# Altium footprint library ICs And Semiconductors THD.PcbLib: 350 footprints (part 6 of 22)
Each footprint in its own frame and in the unit in brackets; x right, y up, seen from the top. Pads: shape width x height; smd on the part's side, far side on the other; paste and mask are expansions set on the pad; w line width, h text height; cw(c..) or ccw(c..) is an arc to the next point about the centre after c.
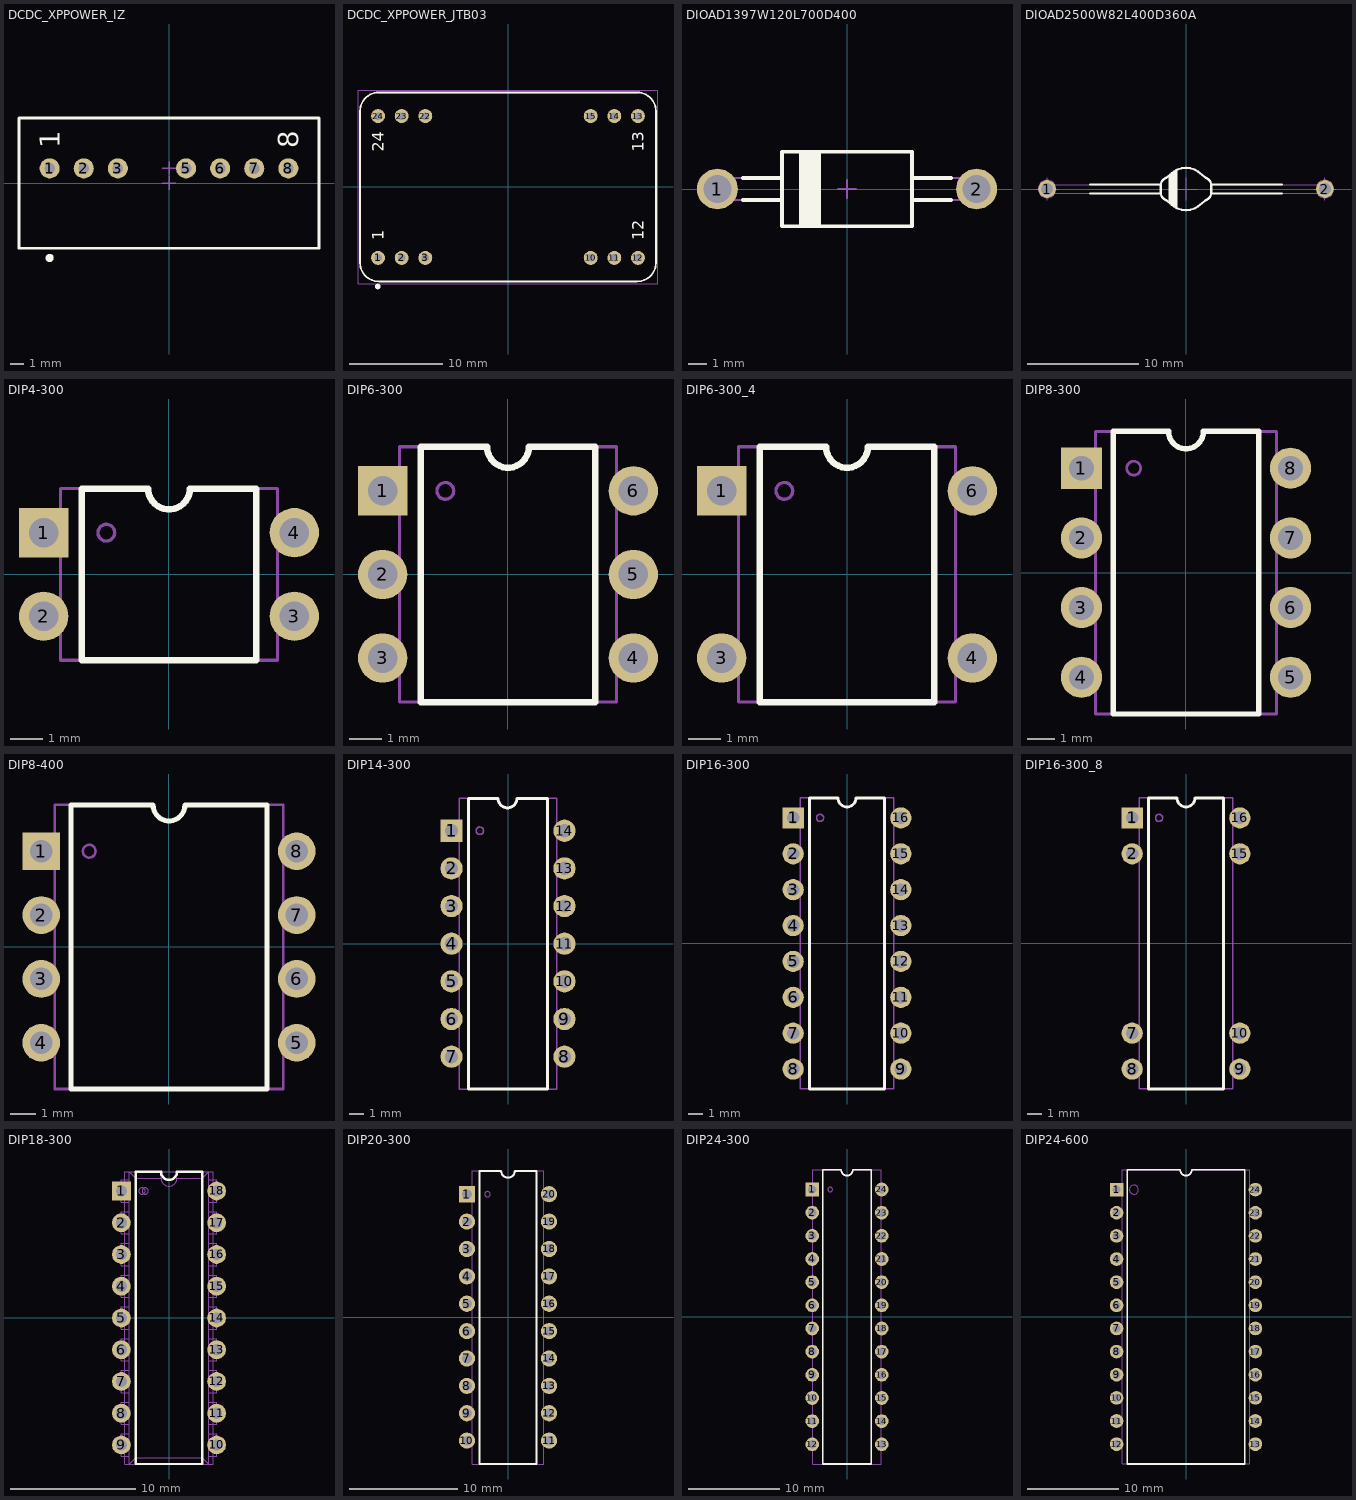
[diagram p5: the footprints below, top view; thin cyan lines are the x and y axes]

## DCDC_XPPOWER_IZ [mm] "SIP-8 Package DC-DC Converter,Body 21.85x11.1mm, IZ Serie"
height 11.6
pads (7):
  round 1.5 hole 0.8: 1(-8.89,1.1) 2(-6.35,1.1) 3(-3.81,1.1) 5(1.27,1.1) 6(3.81,1.1) 7(6.35,1.1) 8(8.89,1.1)
Top Overlay:
  circle w0.3: c-8.89,-5.567 r0.15
  lines w0.2: -11.175,-4.85 -11.175,4.85 11.175,4.85 11.175,-4.85 -11.175,-4.85
  text "8" at 9.64,2.6 h1.5
  text "1" at -8.14,2.6 h1.5
Notvisible:
  lines w0.1: -9.39,1.1 -8.89,1.1 ; -8.89,0.6 -8.89,1.1 ; -8.89,1.6 -8.89,1.1 ; -8.39,1.1 -8.89,1.1 ; -6.85,1.1 -6.35,1.1 ; -6.35,0.6 -6.35,1.1 ; -6.35,1.6 -6.35,1.1 ; -5.85,1.1 -6.35,1.1 ; -4.31,1.1 -3.81,1.1 ; -3.81,0.6 -3.81,1.1 ; -3.81,1.6 -3.81,1.1 ; -3.31,1.1 -3.81,1.1 ; -0.5,0 0,0 ; -0.5,1.1 0,1.1 ; 0,-0.5 0,0 ; 0,0.5 0,0 ; 0,0.6 0,1.1 ; 0,1.6 0,1.1 ; 0.5,0 0,0 ; 0.5,1.1 0,1.1 ; 0.77,1.1 1.27,1.1 ; 1.27,0.6 1.27,1.1 ; 1.27,1.6 1.27,1.1 ; 1.77,1.1 1.27,1.1 ; 3.31,1.1 3.81,1.1 ; 3.81,0.6 3.81,1.1 ; 3.81,1.6 3.81,1.1 ; 4.31,1.1 3.81,1.1 ; 5.85,1.1 6.35,1.1 ; 6.35,0.6 6.35,1.1 ; 6.35,1.6 6.35,1.1 ; 6.85,1.1 6.35,1.1 ; 8.39,1.1 8.89,1.1 ; 8.89,0.6 8.89,1.1 ; 8.89,1.6 8.89,1.1 ; 9.39,1.1 8.89,1.1
  text "2" at -5.6,2.6 h1.5
  text "3" at -3.06,2.6 h1.5
  text "5" at 2.02,2.6 h1.5
  text "6" at 4.56,2.6 h1.5
  text "7" at 7.1,2.6 h1.5
Mechanical 14:
  lines w0.1: -11.175,-4.85 11.175,-4.85 11.175,4.85 -11.175,4.85 -11.175,-4.85
  text "8" at 9.64,2.6 h1.5
  text "1" at -8.14,2.6 h1.5
3D body "DCDC_XPPOWER_IZ.stp": height 11.6, standoff -3.05, extent -11.175,-4.85 11.175,4.85

## DCDC_XPPOWER_JTB03 [mm] "JTB03 Series , Body 31.8x20.3mm, Pitch 2.54mm"
height 10.2
pads (12):
  round 1.5 hole 0.8: 1(-13.97,-7.62) 2(-11.43,-7.62) 3(-8.89,-7.62) 10(8.89,-7.62) 11(11.43,-7.62) 12(13.97,-7.62) 13(13.97,7.62) 14(11.43,7.62) 15(8.89,7.62) 22(-8.89,7.62) 23(-11.43,7.62) 24(-13.97,7.62)
Top Overlay:
  circle w0.3: c-14,-10.7 r0.15
  lines w0.2: -15.9,-8.15 ccw(c-13.9,-8.15) -13.9,-10.15 13.9,-10.15 ccw(c13.9,-8.15) 15.9,-8.15 15.9,8.15 ccw(c13.9,8.15) 13.9,10.15 -13.9,10.15 ccw(c-13.9,8.15) -15.9,8.15 -15.9,-8.15
  text "12" at 14.605,-5.715 h1.27
  text "24" at -13.335,3.81 h1.27
  text "13" at 14.605,3.81 h1.27
  text "1" at -13.335,-5.715 h1.27
Mechanical 14:
  lines w0.1: -15.9,-8.15 ccw(c-13.9,-8.15) -13.9,-10.15 ; -15.9,-8.15 ccw(c-13.9,-8.15) -13.9,-10.15 ; -15.9,-8.15 ccw(c-13.9,-8.15) -13.9,-10.15 ; -15.9,-8.15 -15.9,8.15 ; -15.9,-8.15 -15.9,8.15 ; -15.9,-8.15 -15.9,8.15 ; -15.9,8.15 cw(c-13.9,8.15) -13.9,10.15 ; -15.9,8.15 cw(c-13.9,8.15) -13.9,10.15 ; -15.9,8.15 cw(c-13.9,8.15) -13.9,10.15 ; -13.9,-10.15 13.9,-10.15 ; -13.9,-10.15 13.9,-10.15 ; -13.9,-10.15 13.9,-10.15 ; -13.9,10.15 13.9,10.15 ; -13.9,10.15 13.9,10.15 ; -13.9,10.15 13.9,10.15 ; 13.9,-10.15 ccw(c13.9,-8.15) 15.9,-8.15 ; 13.9,-10.15 ccw(c13.9,-8.15) 15.9,-8.15 ; 13.9,-10.15 ccw(c13.9,-8.15) 15.9,-8.15 ; 13.9,10.15 cw(c13.9,8.15) 15.9,8.15 ; 13.9,10.15 cw(c13.9,8.15) 15.9,8.15 ; 13.9,10.15 cw(c13.9,8.15) 15.9,8.15 ; 15.9,-8.15 15.9,8.15 ; 15.9,-8.15 15.9,8.15 ; 15.9,-8.15 15.9,8.15
  text "24" at -13.335,3.81 h1.27
  text "13" at 14.605,3.81 h1.27
  text "12" at 14.605,-5.715 h1.27
  text "1" at -13.335,-5.715 h1.27
Mechanical 15:
  lines w0.05: -16.125,-10.41 -16.125,10.41 16.125,10.41 16.125,-10.41 -16.125,-10.41
3D body "DCDC_XPPOWER_JTB03.stp": height 10.2, standoff -3.8, extent -15.9,-10.15 15.9,10.15

## DIOAD1397W120L700D400 [mm] "Diode, Axial; Lead Spacing 13.97mm, Lead Dia. 1.20mm, Body Length 7mm, Body Dia. 4mm"
height 4
pads (2):
  round 2.2 hole 1.5: 1(-6.985,0) 2(6.985,0)
Top Overlay:
  lines w0.2: -5.608,-0.595 -3.5,-0.595 ; -5.608,0.595 -3.5,0.595 ; -2.5,-2 -2.5,2 ; -2.389,-2 -2.389,2 ; -2.262,-2 -2.262,2 ; -2.135,-2 -2.135,2 ; -2.008,-2 -2.008,2 ; -1.881,-2 -1.881,2 ; -1.754,-2 -1.754,2 ; -1.627,-2 -1.627,2 ; -1.5,-2 -1.5,2 ; 3.5,-0.595 5.608,-0.595 ; 3.5,0.595 5.608,0.595 ; -3.5,-2 3.5,-2 3.5,2 -3.5,2 -3.5,-2
Notvisible:
  lines w0.1: -7.485,0 -6.985,0 ; -6.985,-0.5 -6.985,0 ; -6.985,0.5 -6.985,0 ; -6.485,0 -6.985,0 ; -0.5,0 0,0 ; 0,-0.5 0,0 ; 0,0.5 0,0 ; 0.5,0 0,0 ; 6.485,0 6.985,0 ; 6.985,-0.5 6.985,0 ; 6.985,0.5 6.985,0 ; 7.485,0 6.985,0
Mechanical 14:
  lines w0.1: -3.5,-0.595 -6.985,-0.595 cw(c-6.985,0) -6.985,0.595 -3.5,0.595 ; -2.5,-2 -2.5,2 ; -1.5,-2 -1.5,2 ; 3.5,-0.595 6.985,-0.595 ccw(c6.985,0) 6.985,0.595 3.5,0.595 ; -3.5,-2 3.5,-2 3.5,2 -3.5,2 -3.5,-2
3D body "NTE_NTE506.stp": height 4, standoff -3.6, extent -7.58,-2 7.58,2

## DIOAD2500W82L400D360A [mm] "Diode, Axial; Lead Spacing 25.00mm, Lead Dia. 0.82mm, Body Length 4.00mm, Body Dia. 3.60mm, Standoff Height 1.4mm"
height 4.6
pads (2):
  round 1.6 hole 1.1: 1(-12.5,0) 2(12.5,0)
Top Overlay:
  lines w0.2: -8.621,-0.4 -2.28,-0.4 ; -8.621,0.4 -2.28,0.4 ; -1.474,-1.244 -1.474,1.244 ; -1.274,-1.41 -1.274,1.41 ; -1.074,-1.568 -1.074,1.568 ; -0.874,-1.689 -0.874,1.689 ; 8.621,-0.4 2.28,-0.4 ; 8.621,0.4 2.28,0.4 ; -2.28,-0.4 ccw(c-1.512,-0.28) -1.883,-0.962 cw(c-2.839,-2.719) -1.681,-1.089 cw(c-4.575,-5.166) -1.26,-1.423 ccw(c0,0) -0.92,-1.663 -0.813,-1.723 ccw(c0,0) 0,-1.905 ccw(c0,0) 0.813,-1.723 0.92,-1.663 ccw(c0,0) 1.26,-1.423 cw(c4.575,-5.166) 1.681,-1.089 cw(c2.839,-2.719) 1.883,-0.962 ccw(c1.512,-0.28) 2.28,-0.4 ; -2.28,-0.4 -2.28,0 -2.28,0.4 ; -2.28,0.4 cw(c-1.512,0.28) -1.883,0.962 ccw(c-2.839,2.719) -1.681,1.089 ccw(c-4.575,5.166) -1.26,1.423 cw(c0,0) -0.92,1.663 -0.813,1.723 cw(c0,0) 0,1.905 cw(c0,0) 0.813,1.723 0.92,1.663 cw(c0,0) 1.26,1.423 ccw(c4.575,5.166) 1.681,1.089 ccw(c2.839,2.719) 1.883,0.962 cw(c1.512,0.28) 2.28,0.4 ; 2.28,-0.4 2.28,0 2.28,0.4
Notvisible:
  lines w0.1: -13.5,0 -12.5,0 ; -12.5,-1 -12.5,0 ; -12.5,1 -12.5,0 ; -11.5,0 -12.5,0 ; -1,0 0,0 ; 0,-1 0,0 ; 0,1 0,0 ; 1,0 0,0 ; 11.5,0 12.5,0 ; 12.5,-1 12.5,0 ; 12.5,1 12.5,0 ; 13.5,0 12.5,0
Mechanical 14:
  lines w0.1: -12.123,-0.4 cw(c-12.5,0) -12.123,0.4 ; -11.807,-0.4 cw(c-12.5,0) -11.807,0.4 ; -1.474,-1.244 -1.474,1.244 ; -1.274,-1.41 -1.274,1.41 ; -1.074,-1.568 -1.074,1.568 ; -0.874,-1.689 -0.874,1.689 ; 11.807,-0.4 ccw(c12.5,0) 11.807,0.4 ; 12.123,-0.4 ccw(c12.5,0) 12.123,0.4 ; -2.28,-0.4 ccw(c-1.512,-0.28) -1.883,-0.962 cw(c-2.839,-2.719) -1.681,-1.089 cw(c-4.575,-5.166) -1.26,-1.423 ccw(c0,0) -0.92,-1.663 -0.813,-1.723 ccw(c0,0) 0,-1.905 ccw(c0,0) 0.813,-1.723 0.92,-1.663 ccw(c0,0) 1.26,-1.423 cw(c4.575,-5.166) 1.681,-1.089 cw(c2.839,-2.719) 1.883,-0.962 ccw(c1.512,-0.28) 2.28,-0.4 ; -2.28,-0.4 -2.28,0 -2.28,0.4 ; -2.28,-0.4 -12.5,-0.4 cw(c-12.5,0) -12.5,0.4 -2.28,0.4 ; -2.28,0.4 cw(c-1.512,0.28) -1.883,0.962 ccw(c-2.839,2.719) -1.681,1.089 ccw(c-4.575,5.166) -1.26,1.423 cw(c0,0) -0.92,1.663 -0.813,1.723 cw(c0,0) 0,1.905 cw(c0,0) 0.813,1.723 0.92,1.663 cw(c0,0) 1.26,1.423 ccw(c4.575,5.166) 1.681,1.089 ccw(c2.839,2.719) 1.883,0.962 cw(c1.512,0.28) 2.28,0.4 ; 2.28,-0.4 2.28,0 2.28,0.4 ; 2.28,-0.4 12.5,-0.4 ccw(c12.5,0) 12.5,0.4 2.28,0.4
3D body "DIOAD2500W82L400D360H460A.stp": height 4.9, standoff -3, extent -12.9,-1.905 12.9,1.905

## DIP4-300 [mm] "DIP 4 Leads, Row Spacing 7.62 mm; Pitch 2.54 mm"
height 5.08
pads (4):
  rect 1.5x1.5 hole 0.9: 1(-3.81,1.27)
  round 1.5 hole 0.9: 2(-3.81,-1.27) 3(3.81,-1.27) 4(3.81,1.27)
Top Overlay:
  lines w0.2: -0.635,2.61 ccw(c0,2.61) 0.635,2.61 ; -0.635,2.61 ccw(c0,2.61) 0.635,2.61 ; -0.635,2.61 -2.65,2.61 -2.65,-2.61 2.65,-2.61 2.65,2.61 0.635,2.61
Mechanical 14:
  circle w0.1: c-1.905,1.27 r0.254
  lines w0.1: -3.3,-2.61 3.3,-2.61 3.3,2.61 0.635,2.61 cw(c0,2.61) -0.635,2.61 -3.3,2.61 -3.3,-2.61
3D body "DIP4-300.stp": height 5.33, standoff -3.3, extent -3.935,-2.54 3.935,2.54

## DIP6-300 [mm] "DIP 6 Leads, Row Spacing 7.62 mm; Pitch 2.54 mm"
height 5.08
pads (6):
  rect 1.5x1.5 hole 0.9: 1(-3.81,2.54)
  round 1.5 hole 0.9: 2(-3.81,0) 3(-3.81,-2.54) 4(3.81,-2.54) 5(3.81,0) 6(3.81,2.54)
Top Overlay:
  lines w0.2: -0.635,3.88 ccw(c0,3.88) 0.635,3.88 ; -0.635,3.88 ccw(c0,3.88) 0.635,3.88 ; -0.635,3.88 -2.65,3.88 -2.65,-3.88 2.65,-3.88 2.65,3.88 0.635,3.88
Mechanical 14:
  circle w0.1: c-1.905,2.54 r0.254
  lines w0.1: -3.3,-3.88 -3.3,3.88 -0.635,3.88 ccw(c0,3.88) 0.635,3.88 3.3,3.88 3.3,-3.88 -3.3,-3.88
3D body "DIP6-300.stp": height 5.33, standoff -3.3, extent -3.935,-3.81 3.935,3.81

## DIP6-300_4 [mm] "DIP 6, 4 Leads, Row Spacing 7.62 mm; Pitch 2.54 mm"
height 5.08
pads (4):
  rect 1.5x1.5 hole 0.9: 1(-3.81,2.54)
  round 1.5 hole 0.9: 3(-3.81,-2.54) 4(3.81,-2.54) 6(3.81,2.54)
Top Overlay:
  lines w0.2: -0.635,3.88 ccw(c0,3.88) 0.635,3.88 ; -0.635,3.88 ccw(c0,3.88) 0.635,3.88 ; -0.635,3.88 -2.65,3.88 -2.65,-3.88 2.65,-3.88 2.65,3.88 0.635,3.88
Mechanical 14:
  circle w0.1: c-1.905,2.54 r0.254
  lines w0.1: -3.3,-3.88 3.3,-3.88 3.3,3.88 0.6,3.88 cw(c-0.035,3.88) -0.67,3.88 -3.3,3.88 -3.3,-3.88
3D body "DIP6-300_4.stp": height 5.33, standoff -3.3, extent -3.935,-3.81 3.935,3.81

## DIP8-300 [mm] "DIP 8 Leads, Row Spacing 7.62 mm; Pitch 2.54 mm"
height 5.08
pads (8):
  rect 1.5x1.5 hole 0.9: 1(-3.81,3.81)
  round 1.5 hole 0.9: 2(-3.81,1.27) 3(-3.81,-1.27) 4(-3.81,-3.81) 5(3.81,-3.81) 6(3.81,-1.27) 7(3.81,1.27) 8(3.81,3.81)
Top Overlay:
  lines w0.2: -0.635,5.15 ccw(c0,5.15) 0.635,5.15 ; -0.635,5.15 ccw(c0,5.15) 0.635,5.15 ; -0.635,5.15 -2.65,5.15 -2.65,-5.15 2.65,-5.15 2.65,5.15 0.635,5.15
Mechanical 14:
  circle w0.1: c-1.905,3.81 r0.254
  lines w0.1: -3.3,-5.15 3.3,-5.15 3.3,5.15 0.635,5.15 cw(c0,5.15) -0.635,5.15 -3.3,5.15 -3.3,-5.15
3D body "DIP8-300.stp": height 5.33, standoff -3.3, extent -3.935,-5.08 3.935,5.08

## DIP8-400 [mm] "DIP 8 Leads, Row Spacing 10.16mm; Pitch 2.54 mm"
height 5.08
pads (8):
  rect 1.5x1.5 hole 0.9: 1(-5.08,3.81)
  round 1.5 hole 0.9: 2(-5.08,1.27) 3(-5.08,-1.27) 4(-5.08,-3.81) 5(5.08,-3.81) 6(5.08,-1.27) 7(5.08,1.27) 8(5.08,3.81)
Top Overlay:
  lines w0.2: -3.9,-5.65 3.9,-5.65 3.9,5.65 0.635,5.65 cw(c0,5.65) -0.635,5.65 -3.9,5.65 -3.9,-5.65
Mechanical 14:
  circle w0.1: c-3.175,3.81 r0.254
  lines w0.1: -4.55,-5.65 -4.55,5.65 -0.65,5.65 ccw(c-0.015,5.65) 0.62,5.65 4.55,5.65 4.55,-5.65 -4.55,-5.65
3D body "DIP8-400.stp": height 5.33, standoff -3.3, extent -5.205,-5.65 5.205,5.65

## DIP14-300 [mm] "DIP 14 Leads, Row Spacing 7.62 mm; Pitch 2.54 mm"
height 5.08
pads (14):
  rect 1.5x1.5 hole 0.9: 1(-3.81,7.62)
  round 1.5 hole 0.9: 2(-3.81,5.08) 3(-3.81,2.54) 4(-3.81,0) 5(-3.81,-2.54) 6(-3.81,-5.08) 7(-3.81,-7.62) 8(3.81,-7.62) 9(3.81,-5.08) 10(3.81,-2.54) 11(3.81,0) 12(3.81,2.54) 13(3.81,5.08) 14(3.81,7.62)
Top Overlay:
  lines w0.2: -0.685,9.8 -2.65,9.8 -2.65,-9.8 2.65,-9.8 2.65,9.8 ; -0.67,9.8 ccw(c-0.035,9.8) 0.6,9.8 2.615,9.8
Mechanical 14:
  circle w0.1: c-1.905,7.62 r0.254
  lines w0.1: -3.3,-9.8 3.3,-9.8 3.3,9.8 0.6,9.8 cw(c-0.035,9.8) -0.67,9.8 -3.3,9.8 -3.3,-9.8
3D body "DIP14-300.stp": height 5.33, standoff -3.3, extent -3.935,-9.845 3.935,9.845

## DIP16-300 [mm] "DIP 16 Leads, Row Spacing 7.62 mm; Pitch 2.54 mm"
height 5.08
pads (16):
  rect 1.5x1.5 hole 0.9: 1(-3.81,8.89)
  round 1.5 hole 0.9: 2(-3.81,6.35) 3(-3.81,3.81) 4(-3.81,1.27) 5(-3.81,-1.27) 6(-3.81,-3.81) 7(-3.81,-6.35) 8(-3.81,-8.89) 9(3.81,-8.89) 10(3.81,-6.35) 11(3.81,-3.81) 12(3.81,-1.27) 13(3.81,1.27) 14(3.81,3.81) 15(3.81,6.35) 16(3.81,8.89)
Top Overlay:
  lines w0.2: -2.65,-10.3 -2.65,10.3 -0.635,10.3 ccw(c0,10.3) 0.635,10.3 2.65,10.3 2.65,-10.3 -2.65,-10.3
Mechanical 14:
  circle w0.1: c-1.905,8.89 r0.254
  lines w0.1: -3.3,-10.3 3.3,-10.3 3.3,10.3 0.6,10.3 cw(c-0.035,10.3) -0.67,10.3 -3.3,10.3 -3.3,-10.3
3D body "DIP16-300.stp": height 5.33, standoff -3.3, extent -3.935,-10.16 3.935,10.16

## DIP16-300_8 [mm] "DIP 16 Leads, Row Spacing 7.62 mm; Pitch 2.54 mm"
height 5.08
pads (8):
  rect 1.5x1.5 hole 0.9: 1(-3.81,8.89)
  round 1.5 hole 0.9: 2(-3.81,6.35) 7(-3.81,-6.35) 8(-3.81,-8.89) 9(3.81,-8.89) 10(3.81,-6.35) 15(3.81,6.35) 16(3.81,8.89)
Top Overlay:
  lines w0.2: -2.65,-10.3 2.65,-10.3 2.65,10.3 0.635,10.3 cw(c0,10.3) -0.635,10.3 -2.65,10.3 -2.65,-10.3
Mechanical 14:
  circle w0.1: c-1.905,8.89 r0.254
  lines w0.1: -3.3,-10.3 -3.3,10.3 -0.67,10.3 ccw(c-0.035,10.3) 0.6,10.3 3.3,10.3 3.3,-10.3 -3.3,-10.3
3D body "DIP16-300_8.stp": height 5.33, standoff -3.3, extent -3.935,-10.16 3.935,10.16

## DIP18-300 [mm] "DIP 18 Leads, Row Spacing 7.62 mm; Pitch 2.54 mm"
height 5.08
pads (18):
  rect 1.5x1.5 hole 0.9: 1(-3.81,10.16)
  round 1.5 hole 0.9: 2(-3.81,7.62) 3(-3.81,5.08) 4(-3.81,2.54) 5(-3.81,0) 6(-3.81,-2.54) 7(-3.81,-5.08) 8(-3.81,-7.62) 9(-3.81,-10.16) 10(3.81,-10.16) 11(3.81,-7.62) 12(3.81,-5.08) 13(3.81,-2.54) 14(3.81,0) 15(3.81,2.54) 16(3.81,5.08) 17(3.81,7.62) 18(3.81,10.16)
Top Overlay:
  lines w0.2: -2.65,-11.685 -2.65,11.685 -0.635,11.685 ccw(c0,11.685) 0.635,11.685 2.65,11.685 2.65,-11.685 -2.65,-11.685
Notvisible:
  circle w0.05: c-2.159,10.16 r0.254
  lines w0.05: -3.175,-11.05 -3.81,-11.05 -3.81,-10.44 -3.935,-10.44 -3.935,-9.88 -3.81,-9.88 -3.81,-9.27 -3.175,-9.27 ; -3.175,-8.51 -3.81,-8.51 -3.81,-7.9 -3.935,-7.9 -3.935,-7.34 -3.81,-7.34 -3.81,-6.73 -3.175,-6.73 ; -3.175,-5.97 -3.81,-5.97 -3.81,-5.36 -3.935,-5.36 -3.935,-4.8 -3.81,-4.8 -3.81,-4.19 -3.175,-4.19 ; -3.175,-3.43 -3.81,-3.43 -3.81,-2.82 -3.935,-2.82 -3.935,-2.26 -3.81,-2.26 -3.81,-1.65 -3.175,-1.65 ; -3.175,-0.89 -3.81,-0.89 -3.81,-0.28 -3.935,-0.28 -3.935,0.28 -3.81,0.28 -3.81,0.89 -3.175,0.89 ; -3.175,1.65 -3.81,1.65 -3.81,2.26 -3.935,2.26 -3.935,2.82 -3.81,2.82 -3.81,3.43 -3.175,3.43 ; -3.175,4.19 -3.81,4.19 -3.81,4.8 -3.935,4.8 -3.935,5.36 -3.81,5.36 -3.81,5.97 -3.175,5.97 ; -3.175,6.73 -3.81,6.73 -3.81,7.34 -3.935,7.34 -3.935,7.9 -3.81,7.9 -3.81,8.51 -3.175,8.51 ; -3.175,9.27 -3.81,9.27 -3.81,9.88 -3.935,9.88 -3.935,10.44 -3.81,10.44 -3.81,11.05 -3.175,11.05 ; -0.635,11.685 -0.635,11.177 ; 0.635,11.685 0.635,11.177 ; 3.175,-11.05 3.81,-11.05 3.81,-10.44 3.935,-10.44 3.935,-9.88 3.81,-9.88 3.81,-9.27 3.175,-9.27 ; 3.175,-8.51 3.81,-8.51 3.81,-7.9 3.935,-7.9 3.935,-7.34 3.81,-7.34 3.81,-6.73 3.175,-6.73 ; 3.175,-5.97 3.81,-5.97 3.81,-5.36 3.935,-5.36 3.935,-4.8 3.81,-4.8 3.81,-4.19 3.175,-4.19 ; 3.175,-3.43 3.81,-3.43 3.81,-2.82 3.935,-2.82 3.935,-2.26 3.81,-2.26 3.81,-1.65 3.175,-1.65 ; 3.175,-0.89 3.81,-0.89 3.81,-0.28 3.935,-0.28 3.935,0.28 3.81,0.28 3.81,0.89 3.175,0.89 ; 3.175,1.65 3.81,1.65 3.81,2.26 3.935,2.26 3.935,2.82 3.81,2.82 3.81,3.43 3.175,3.43 ; 3.175,4.19 3.81,4.19 3.81,4.8 3.935,4.8 3.935,5.36 3.81,5.36 3.81,5.97 3.175,5.97 ; 3.175,6.73 3.81,6.73 3.81,7.34 3.935,7.34 3.935,7.9 3.81,7.9 3.81,8.51 3.175,8.51 ; 3.175,9.27 3.81,9.27 3.81,9.88 3.935,9.88 3.935,10.44 3.81,10.44 3.81,11.05 3.175,11.05 ; -3.175,-11.685 -2.667,-11.177 ; -3.175,-11.685 -3.175,11.685 ; -3.175,-11.685 3.175,-11.685 ; -3.175,11.685 -2.667,11.177 ; -3.175,11.685 3.175,11.685 ; -2.667,-11.177 -2.667,11.177 ; -2.667,-11.177 2.667,-11.177 ; -2.667,11.177 -0.635,11.177 ; -0.635,11.177 ccw(c0,11.177) 0.635,11.177 ; 0.635,11.177 2.667,11.177 ; 2.667,-11.177 3.175,-11.685 ; 2.667,-11.177 2.667,11.177 ; 2.667,11.177 3.175,11.685 ; 3.175,-11.685 3.175,11.685
Mechanical 14:
  circle w0.1: c-1.905,10.16 r0.254
  lines w0.1: -3.555,-11.685 3.555,-11.685 3.555,11.685 0.635,11.685 cw(c0,11.685) -0.635,11.685 -3.555,11.685 -3.555,-11.685
3D body "DIP18-300.stp": height 5.33, standoff -3.3, extent -3.935,-11.685 3.935,11.685

## DIP20-300 [mm] "DIP 20 Leads, Row Spacing 7.62 mm; Pitch 2.54 mm"
height 5.08
pads (20):
  rect 1.5x1.5 hole 0.9: 1(-3.81,11.43)
  round 1.5 hole 0.9: 2(-3.81,8.89) 3(-3.81,6.35) 4(-3.81,3.81) 5(-3.81,1.27) 6(-3.81,-1.27) 7(-3.81,-3.81) 8(-3.81,-6.35) 9(-3.81,-8.89) 10(-3.81,-11.43) 11(3.81,-11.43) 12(3.81,-8.89) 13(3.81,-6.35) 14(3.81,-3.81) 15(3.81,-1.27) 16(3.81,1.27) 17(3.81,3.81) 18(3.81,6.35) 19(3.81,8.89) 20(3.81,11.43)
Top Overlay:
  lines w0.2: -2.65,-13.6 2.65,-13.6 2.65,13.6 0.635,13.6 cw(c0,13.6) -0.635,13.6 -2.65,13.6 -2.65,-13.6
Mechanical 14:
  circle w0.1: c-1.905,11.43 r0.254
  lines w0.1: -3.3,-13.6 3.3,-13.6 3.3,13.6 0.6,13.6 cw(c-0.035,13.6) -0.67,13.6 -3.3,13.6 -3.3,-13.6
3D body "DIP20-300.stp": height 5.33, standoff -3.3, extent -3.935,-13.46 3.935,13.46

## DIP24-300 [mm] "DIP 24 Leads, Row Spacing 7.62mm; Pitch 2.54mm"
height 5.08
pads (24):
  rect 1.5x1.5 hole 0.9: 1(-3.81,13.97)
  round 1.5 hole 0.9: 2(-3.81,11.43) 3(-3.81,8.89) 4(-3.81,6.35) 5(-3.81,3.81) 6(-3.81,1.27) 7(-3.81,-1.27) 8(-3.81,-3.81) 9(-3.81,-6.35) 10(-3.81,-8.89) 11(-3.81,-11.43) 12(-3.81,-13.97) 13(3.81,-13.97) 14(3.81,-11.43) 15(3.81,-8.89) 16(3.81,-6.35) 17(3.81,-3.81) 18(3.81,-1.27) 19(3.81,1.27) 20(3.81,3.81) 21(3.81,6.35) 22(3.81,8.89) 23(3.81,11.43) 24(3.81,13.97)
Top Overlay:
  lines w0.2: -2.65,-16.13 -2.65,16.13 -0.635,16.13 ccw(c0,16.13) 0.635,16.13 2.65,16.13 2.65,-16.13 -2.65,-16.13
Mechanical 14:
  circle w0.1: c-1.84,13.97 r0.254
  lines w0.1: -3.745,-16.13 -3.745,16.13 -0.635,16.13 ccw(c0,16.13) 0.635,16.13 3.745,16.13 3.745,-16.13 -3.745,-16.13
3D body "DIP24-300.stp": height 5.08, standoff -3.3, extent -3.935,-16.13 3.935,16.13

## DIP24-600 [mm] "24 Leads Dual In-Line Package, Row Spacing 15.24mm; Pitch 2.54mm"
height 5.1
pads (24):
  rect 1.5x1.5 hole 0.9: 1(-7.62,13.97)
  round 1.5 hole 0.9: 2(-7.62,11.43) 3(-7.62,8.89) 4(-7.62,6.35) 5(-7.62,3.81) 6(-7.62,1.27) 7(-7.62,-1.27) 8(-7.62,-3.81) 9(-7.62,-6.35) 10(-7.62,-8.89) 11(-7.62,-11.43) 12(-7.62,-13.97) 13(7.62,-13.97) 14(7.62,-11.43) 15(7.62,-8.89) 16(7.62,-6.35) 17(7.62,-3.81) 18(7.62,-1.27) 19(7.62,1.27) 20(7.62,3.81) 21(7.62,6.35) 22(7.62,8.89) 23(7.62,11.43) 24(7.62,13.97)
Top Overlay:
  lines w0.2: -6.45,-16.15 -6.45,16.15 -0.635,16.15 ccw(c0,16.15) 0.635,16.15 6.45,16.15 6.45,-16.15 -6.45,-16.15
Mechanical 14:
  circle w0.1: c-5.715,13.97 r0.5
  lines w0.1: -7,-16.15 -7,16.15 -0.635,16.15 ccw(c0,16.15) 0.635,16.15 7,16.15 7,-16.15 -7,-16.15
3D body "DIP24-600.stp": height 5.72, standoff -3.3, extent -7.745,-16 7.745,16